# Altium footprint library LimeMicroAltiumLib_pcbLib.PcbLib: 224 footprints (part 15 of 15)
Each footprint in its own frame and in the unit in brackets; x right, y up, seen from the top. Pads: shape width x height; smd on the part's side, far side on the other; paste and mask are expansions set on the pad; w line width, h text height; cw(c..) or ccw(c..) is an arc to the next point about the centre after c.
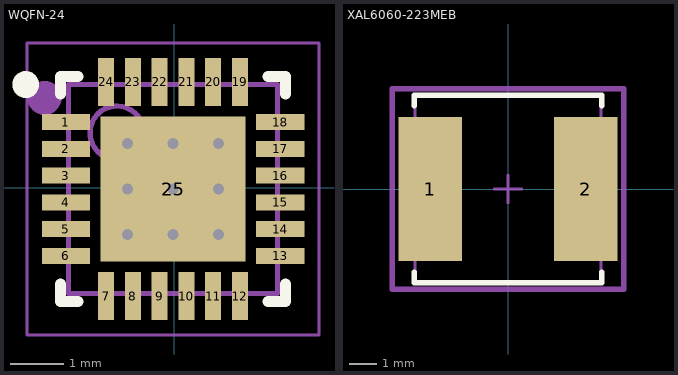
[diagram p14: the footprints below, top view; thin cyan lines are the x and y axes]

## WQFN-24 [mm]
pads (25):
  rect 0.9x0.3 smd mask+0.05: 1(-2.025,1.225) 2(-2.025,0.725) 3(-2.025,0.225) 4(-2.025,-0.275) 5(-2.025,-0.775) 6(-2.025,-1.275) 13(1.975,-1.275) 14(1.975,-0.775) 15(1.975,-0.275) 16(1.975,0.225) 17(1.975,0.725) 18(1.975,1.225)
  rect 0.3x0.9 smd mask+0.05: 7(-1.275,-2.025) 8(-0.775,-2.025) 9(-0.275,-2.025) 10(0.225,-2.025) 11(0.725,-2.025) 12(1.225,-2.025) 19(1.225,1.975) 20(0.725,1.975) 21(0.225,1.975) 22(-0.275,1.975) 23(-0.775,1.975) 24(-1.275,1.975)
  rect 2.7x2.7 smd mask+0.05: 25(-0.025,-0.025)
via 0.825,0.825 diameter 0.5 hole 0.2
via -0.875,0.825 diameter 0.5 hole 0.2
via -0.025,0.825 diameter 0.5 hole 0.2
via -0.025,-0.875 diameter 0.5 hole 0.2
via 0.825,-0.875 diameter 0.5 hole 0.2
via -0.875,-0.875 diameter 0.5 hole 0.2
via -0.875,-0.025 diameter 0.5 hole 0.2
via 0.825,-0.025 diameter 0.5 hole 0.2
via -0.025,-0.025 diameter 0.5 hole 0.2
Top Overlay:
  circle w0.25: c-2.775,1.925 r0.125
  lines w0.2: -2.125,-1.8 -2.125,-2.125 -1.8,-2.125 ; -2.125,1.75 -2.125,2.075 -1.8,2.075 ; 1.75,-2.125 2.075,-2.125 2.075,-1.8 ; 1.75,2.075 2.075,2.075 2.075,1.75
Mechanical 13:
  circle w0.1: c-1.075,1.025 r0.5
  lines w0.1: -1.975,-1.975 -1.975,1.925 1.925,1.925 1.925,-1.975 -1.975,-1.975
Mechanical 15:
  circle w0.35: c-2.425,1.675 r0.141
  lines w0.05: -2.75,-2.75 -2.75,2.7 2.7,2.7 2.7,-2.75 -2.75,-2.75
  lines w0.1: -0.525,-0.025 0.475,-0.025 ; -0.025,-0.525 -0.025,0.475
3D body "User Library-WQFN-24.STEP": height 0.8, standoff 0, extent -2.039,-2.039 1.981,1.981

## XAL6060-223MEB [mm] "Precision Wire Wound Inductor, 2-Leads, Body 6,56x6,56mm, IPC Medium Density"
height 6.1
pads (2):
  rect 2.3x5.25 smd: 1(-2.825,0) 2(2.825,0)
Top Overlay:
  lines w0.2: -3.4,-3.025 -3.4,-3.4 3.4,-3.4 3.4,-3.025 ; -3.4,3.025 -3.4,3.4 3.4,3.4 3.4,3.025
Mechanical 13:
  lines w0.1: -3.38,-3.38 3.38,-3.38 3.38,3.38 -3.38,3.38 -3.38,-3.38
Mechanical 15:
  lines w0.1: -0.5,0 0.5,0 ; 0,-0.5 0,0.5
  lines w0.2: -4.2,-3.65 4.2,-3.65 4.2,3.65 -4.2,3.65 -4.2,-3.65
  text ".Designator" at 0,0 h0.7
  text "no polarity" at -3.6,-2.5 h0.7
3D body "Cooper Bussman DR73 Series Inductor.STEP": height 3.55, standoff 0, extent -3.8,-3.8 3.8,3.8